# Altium footprint library Controller 1.4.PcbLib: 48 footprints (part 3 of 3)
Each footprint in its own frame and in the unit in brackets; x right, y up, seen from the top. Pads: shape width x height; smd on the part's side, far side on the other; paste and mask are expansions set on the pad; w line width, h text height; cw(c..) or ccw(c..) is an arc to the next point about the centre after c.
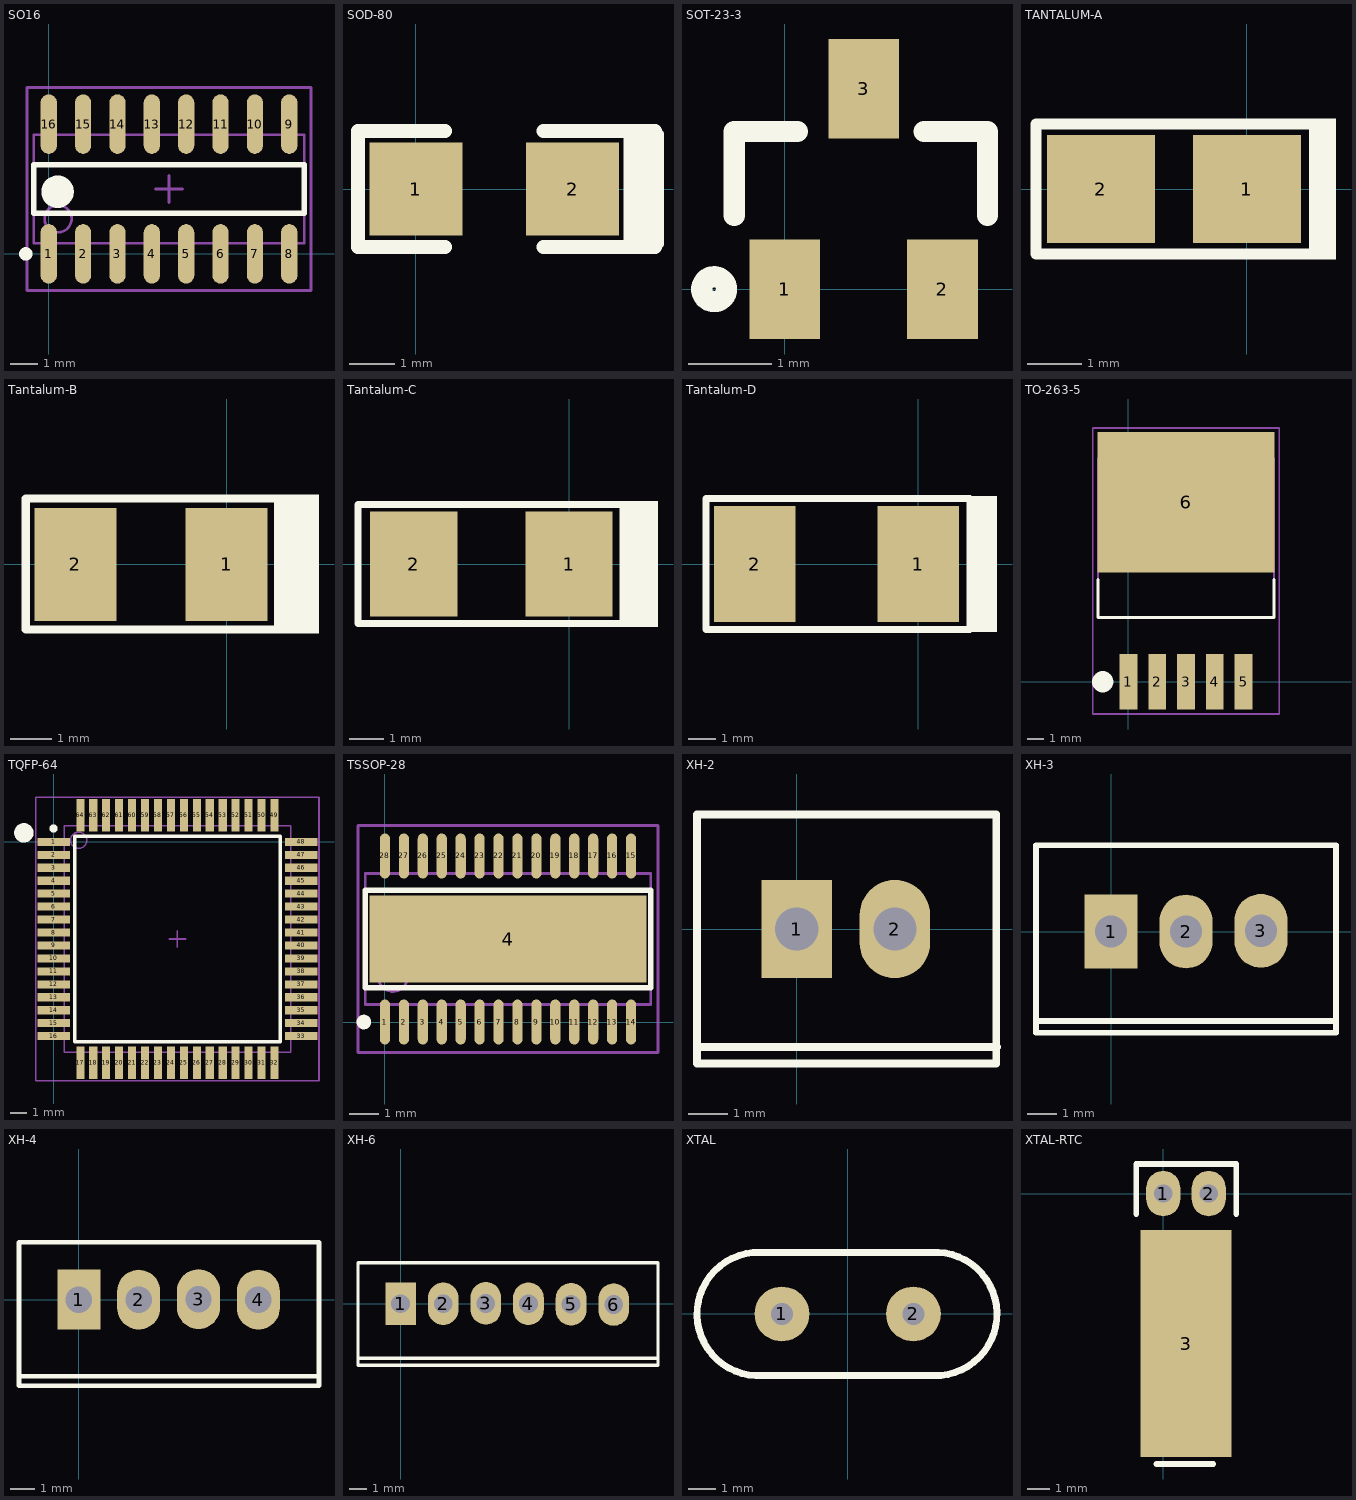
[diagram p2: the footprints below, top view; thin cyan lines are the x and y axes]

## SO16 [mm]
pads (16):
  oval 0.6x2.2 smd: 1(0,0) 2(1.27,0) 3(2.54,0) 4(3.81,0) 5(5.08,0) 6(6.35,0) 7(7.62,0) 8(8.89,0) 9(8.89,4.8) 10(7.62,4.8) 11(6.35,4.8) 12(5.08,4.8) 13(3.81,4.8) 14(2.54,4.8) 15(1.27,4.8) 16(0,4.8)
Top Overlay:
  circle w0.25: c-0.85,0 r0.125
  circle w0.6: c0.325,2.3 r0.3
  lines w0.2: -0.555,1.5 9.445,1.5 9.445,3.3 -0.555,3.3 -0.555,1.5
Mechanical 13:
  circle w0.1: c0.345,1.3 r0.5
  lines w0.1: -0.555,0.4 9.445,0.4 9.445,4.4 -0.555,4.4 -0.555,0.4
Mechanical 15:
  lines w0.1: 3.945,2.4 4.945,2.4 ; 4.445,1.9 4.445,2.9 ; -0.805,-1.35 9.695,-1.35 9.695,6.15 -0.805,6.15 -0.805,-1.35
3D body: height 1.73, standoff -0.04, extent -0.54,-0.703 9.43,5.434

## SOD-80 [mil]
pads (2):
  rect 80x80 smd: 1(0,0) 2(135,0)
Top Overlay:
  lines w10: 192.91,-47.24 192.91,47.25 ; 200.79,-47.24 200.79,47.25 ; 208.66,-47.24 208.66,47.25
  lines w12: 25,-50 -50,-50 -50,50 25,50 ; 110,-50 185,-50 185,50
  lines w12.01: 110,50 185,50 ; 153.54,50 205.9,50 ; 173.23,-50 205.9,-50
3D body: height 59.06, standoff 0, extent -0.87,-30 140.87,29.06

## SOT-23-3 [mm]
height 1.7
pads (3):
  rect 0.85x1.2 smd: 1(0,0) 2(1.9,0) 3(0.95,2.413)
Top Overlay:
  circle w0.254: c-0.85,0 r0.15
  lines w0.254: -0.608,0.889 -0.608,1.9 0.154,1.9 ; 1.678,1.9 2.44,1.9 2.44,0.889
3D body: height 1.08, standoff 0, extent -0.55,-0.2 2.45,2.44

## TANTALUM-A [mm]
pads (2):
  rect 2x2 smd: 1(0,0) 2(-2.7,0)
Top Overlay:
  rectangle: 1.15,-1.3 1.65,1.3
  lines w0.2: 1.25,-1.2 -3,-1.2 -3.9,-1.2 -3.9,-0.9 -3.9,0.9 -3.9,1.2 -3,1.2 0.8,1.2 1.25,1.2
3D body: height 1.65, standoff 0, extent -3.045,-0.8 0.345,0.8

## Tantalum-B [mm]
pads (2):
  rect 2x2.75 smd: 1(0,0) 2(-3.69,0)
Top Overlay:
  rectangle: 1.155,-1.69 2.255,1.71
  lines w0.2: 2.005,-1.59 -2.545,-1.59 -4.9,-1.59 -4.9,1.61 -3.145,1.61 1.355,1.61 2.005,1.61
3D body: height 2.09, standoff -0.01, extent -3.69,-1.41 0,1.41

## Tantalum-C [mm]
pads (2):
  rect 2.5x3 smd: 1(0,0) 2(-4.45,0)
Top Overlay:
  rectangle: 1.45,-1.8 2.55,1.8
  lines w0.2: 1.65,-1.7 -2.9,-1.7 -6.05,-1.7 -6.05,1.7 -3.5,1.7 1,1.7 1.65,1.7
3D body: height 2.6, standoff 0, extent -5.1,-1.6 0.7,1.6

## Tantalum-D [mm]
pads (2):
  rect 3x4.25 smd: 1(0,0) 2(-6,0)
Top Overlay:
  rectangle: 1.8,-2.5 2.9,2.5
  lines w0.254: -7.8,-2.4 -7.8,2.4 1.9,2.4 1.9,-2.4 -7.8,-2.4
3D body: height 2.8, standoff 0, extent -6.55,-2.2 0.75,2.1

## TO-263-5 [mm]
pads (6):
  rect 1.05x3.25 smd: 1(0,0) 2(1.7,0) 3(3.4,0) 4(5.1,0) 5(6.8,0)
  rect 10.45x8.3 smd: 6(3.4,10.593)
Top Overlay:
  circle w1: c-1.522,0 r0.125
  lines w0.2: -1.8,6.043 -1.8,3.793 8.6,3.793 8.6,6.043
Mechanical 13:
  lines w0.1: -1.8,3.793 8.6,3.793 8.6,13.193 -1.8,13.193 -1.8,3.793
Mechanical 15:
  lines w0.1: 2.9,7.143 3.9,7.143 ; 3.4,6.643 3.4,7.643 ; -2.1,-1.905 8.9,-1.905 8.9,14.993 -2.1,14.993 -2.1,-1.905
3D body: height 4.56, standoff 0, extent -1.651,-0.426 8.509,13.589

## TQFP-64 [mm]
pads (64):
  rect 2x0.5 smd: 1(0,0) 2(0,-0.8) 3(0,-1.6) 4(0,-2.4) 5(0,-3.2) 6(0,-4) 7(0,-4.8) 8(0,-5.6) 9(0,-6.4) 10(0,-7.2) 11(0,-8) 12(0,-8.8) 13(0,-9.6) 14(0,-10.4) 15(0,-11.2) 16(0,-12) 33(15.3,-12) 34(15.3,-11.2) 35(15.3,-10.4) 36(15.3,-9.6) 37(15.3,-8.8) 38(15.3,-8) 39(15.3,-7.2) 40(15.3,-6.4) 41(15.3,-5.6) 42(15.3,-4.8) 43(15.3,-4) 44(15.3,-3.2) 45(15.3,-2.4) 46(15.3,-1.6) 47(15.3,-0.8) 48(15.3,0)
  rect 0.5x2 smd: 17(1.65,-13.65) 18(2.45,-13.65) 19(3.25,-13.65) 20(4.05,-13.65) 21(4.85,-13.65) 22(5.65,-13.65) 23(6.45,-13.65) 24(7.25,-13.65) 25(8.05,-13.65) 26(8.85,-13.65) 27(9.65,-13.65) 28(10.45,-13.65) 29(11.25,-13.65) 30(12.05,-13.65) 31(12.85,-13.65) 32(13.65,-13.65) 49(13.65,1.65) 50(12.85,1.65) 51(12.05,1.65) 52(11.25,1.65) 53(10.45,1.65) 54(9.65,1.65) 55(8.85,1.65) 56(8.05,1.65) 57(7.25,1.65) 58(6.45,1.65) 59(5.65,1.65) 60(4.85,1.65) 61(4.05,1.65) 62(3.25,1.65) 63(2.45,1.65) 64(1.65,1.65)
Top Overlay:
  circle w0.25: c0,0.825 r0.125
  circle w0.6: c-1.838,0.56 r0.3
  lines w0.2: 1.3,-12.35 1.3,0.35 14,0.35 14,-12.35 1.3,-12.35
Mechanical 13:
  circle w0.1: c1.55,0.1 r0.5
  lines w0.1: 0.65,-13 0.65,1 14.65,1 14.65,-13 0.65,-13
Mechanical 15:
  lines w0.1: 7.15,-6 8.15,-6 ; 7.65,-6.5 7.65,-5.5 ; -1.1,-14.75 -1.1,2.75 16.4,2.75 16.4,-14.75 -1.1,-14.75
3D body: height 1.1, standoff -0.01, extent -0.35,-14 15.65,2

## TSSOP-28 [mm]
pads (29):
  oval 0.35x1.55 smd: 1(0,0) 2(0.65,0) 3(1.3,0) 4(1.95,0) 5(2.6,0) 6(3.25,0) 7(3.9,0) 8(4.55,0) 9(5.2,0) 10(5.85,0) 11(6.5,0) 12(7.15,0) 13(7.8,0) 14(8.45,0) 15(8.45,5.7) 16(7.8,5.7) 17(7.15,5.7) 18(6.5,5.7) 19(5.85,5.7) 20(5.2,5.7) 21(4.55,5.7) 22(3.9,5.7) 23(3.25,5.7) 24(2.6,5.7) 25(1.95,5.7) 26(1.3,5.7) 27(0.65,5.7) 28(0,5.7)
  rect 9.5x3 smd: 4(4.225,2.85)
Top Overlay:
  circle w0.25: c-0.725,0 r0.125
  circle w0.6: c0.325,2.175 r0.3
  lines w0.2: -0.675,1.175 9.125,1.175 9.125,4.525 -0.675,4.525 -0.675,1.175
Mechanical 13:
  circle w0.1: c0.275,1.55 r0.5
  lines w0.1: -0.675,0.6 9.125,0.6 9.125,5.1 -0.675,5.1 -0.675,0.6
Mechanical 15:
  lines w0.1: 3.725,2.85 4.725,2.85 ; 4.225,2.35 4.225,3.35 ; -0.925,-1.05 9.375,-1.05 9.375,6.75 -0.925,6.75 -0.925,-1.05
3D body: height 1.02, standoff 0.03, extent -0.635,-0.381 9.065,6.019

## XH-2 [mm] "2.5mm-xh Header Shrouded Connector"
pads (2):
  rect 1.8x2.5 hole 1.1: 1(0,0)
  oval 1.8x2.5 hole 1.1: 2(2.5,0)
Top Overlay:
  lines w0.2: -2.52,-3 5.1,-3 ; -2.54,-3.429 -2.54,2.921 5.08,2.921 5.08,-3.429 -2.54,-3.429
3D body: height 7, standoff -3.4, extent -2.43,-3.306 4.97,2.794

## XH-3 [mm] "2.5mm-xh Header Shrouded Connector"
pads (3):
  rect 1.8x2.5 hole 1.1: 1(0,0)
  oval 1.8x2.5 hole 1.1: 2(2.54,0) 3(5.08,0.023)
Top Overlay:
  lines w0.2: -2.54,-3.029 7.62,-3.029 ; -2.54,-3.429 7.62,-3.429 7.62,2.921 -2.54,2.921 -2.54,-3.429
3D body: height 7, standoff -3.4, extent -2.41,-3.306 7.49,2.794

## XH-4 [mm]
pads (4):
  rect 1.8x2.5 hole 1.1: 1(0,0)
  oval 1.8x2.5 hole 1.1: 2(2.5,0) 3(5,0.023) 4(7.5,0)
Top Overlay:
  lines w0.2: -2.5,-3.2 10.033,-3.2 ; -2.5,-3.6 10.033,-3.6 10.033,2.4 -2.5,2.4 -2.5,-3.6
3D body: height 7, standoff -3.4, extent -2.517,-3.464 9.883,2.286

## XH-6 [mm]
pads (6):
  rect 1.8x2.5 hole 1.1: 1(0,0)
  oval 1.8x2.5 hole 1.1: 2(2.5,0) 3(5,0.023) 4(7.5,0) 5(10,-0.023) 6(12.5,-0.046)
Top Overlay:
  lines w0.2: -2.5,-3.2 15.1,-3.2 ; -2.5,-3.6 -2.5,2.4 15.1,2.4 15.1,-3.6 -2.5,-3.6
3D body: height 7, standoff -3.4, extent -2.4,-3.45 15,2.3

## XTAL [mm]
pads (2):
  round 2 hole 0.8: 1(-2.4,0) 2(2.4,0)
Top Overlay:
  lines w0.254: -3.2,2.249 ccw(c-3.25,-0.002) -3.1,-2.249 3.149,-2.249 3.15,-2.25 ccw(c3.2,0.002) 3.05,2.249 3.05,2.249 -3.2,2.249
3D body: height 3.5, standoff -4, extent -5.675,-2.286 5.675,2.364

## XTAL-RTC [mm]
pads (3):
  oval 1.5x2 hole 0.8: 1(0,0) 2(2,0)
  rect 4x10 smd: 3(1,-6.6)
Top Overlay:
  lines w0.254: -1.192,-0.9 -1.192,1.3 3.208,1.3 3.208,-0.9 ; -0.3,-11.9 2.2,-11.9
3D body: height 3.35, standoff 0.15, extent -0.75,-10.587 2.7,0.188